# Altium footprint library MOLEX THD.PcbLib: 57 footprints (part 4 of 4) (continued)
## MOLEX_87831-1420_h [mm] "2.00mm (.079\") Pitch Milli-Grid™ Header, Vertical, Shrouded, Center Polarization Slot, Locking Window, 14 Circuits (Customized PCB Edge assembly)" (continued)
3D body "MOLEX_87831-1420_h.stp": height 2.35, standoff -3.95, extent -8.325,-2.5 8.325,6.4

## MOLEX_87833-1420 [mm] "2.00mm (.079\") Pitch Milli-Grid™ Header, Right Angle, Shrouded, Center Polarization Slot, Locking Window, 14 Circuits"
pads (14):
  round 1.6 hole 0.9: 1(-6,-1) 2(-6,1) 3(-4,-1) 4(-4,1) 5(-2,-1) 6(-2,1) 7(0,-1) 8(0,1) 9(2,-1) 10(2,1) 11(4,-1) 12(4,1) 13(6,-1) 14(6,1)
Top Overlay:
  lines w0.2: -7.5,2.7 -7.5,1 -7.1,1 ; -6.325,7.4 -5.825,6.534 -5.325,7.4 ; -5.5,2.7 -5.3,5.3 -4.95,5.3 -4.95,4.7 -3.05,4.7 -3.05,5.3 -2.7,5.3 -2.5,2.7 ; -1.8,7.4 cw(c-1.8,6.8) -1.2,6.8 -1.2,3.65 1.2,3.65 1.2,6.8 cw(c1.8,6.8) 1.8,7.4 ; -0.25,3.65 -0.25,6.65 ; 0.25,3.65 0.25,6.65 ; 2.5,2.7 2.7,5.3 3.05,5.3 3.05,4.7 4.95,4.7 4.95,5.3 5.3,5.3 5.5,2.7 ; 7.1,1 7.5,1 7.5,2.7 ; -0.25,6.65 0.25,6.65 ; -0.25,6.65 -0.1,7.25 0.1,7.25 0.25,6.65 ; -8.325,2.7 8.325,2.7 8.325,7.4 -8.325,7.4 -8.325,2.7
Mechanical 8:
  lines w0.1: -6.5,-1 -6,-1 ; -6.5,1 -6,1 ; -6,-0.5 -6,-1 ; -6,0.5 -6,1 ; -6,1.5 -6,1 ; -5.5,-1 -6,-1 ; -5.5,1 -6,1 ; -4.5,-1 -4,-1 ; -4.5,1 -4,1 ; -4,-0.5 -4,-1 ; -4,0.5 -4,1 ; -4,1.5 -4,1 ; -3.5,-1 -4,-1 ; -3.5,1 -4,1 ; -2.5,-1 -2,-1 ; -2.5,1 -2,1 ; -2,-0.5 -2,-1 ; -2,0.5 -2,1 ; -2,1.5 -2,1 ; -1.5,-1 -2,-1 ; -1.5,1 -2,1 ; -0.5,-1 0,-1 ; -0.5,1 0,1 ; 0,-0.5 0,-1 ; 0,0.5 0,1 ; 0,1.5 0,1 ; 0.5,-1 0,-1 ; 0.5,1 0,1 ; 1.5,-1 2,-1 ; 1.5,1 2,1 ; 2,-0.5 2,-1 ; 2,0.5 2,1 ; 2,1.5 2,1 ; 2.5,-1 2,-1 ; 2.5,1 2,1 ; 3.5,-1 4,-1 ; 3.5,1 4,1 ; 4,-0.5 4,-1 ; 4,0.5 4,1 ; 4,1.5 4,1 ; 4.5,-1 4,-1 ; 4.5,1 4,1 ; 5.5,-1 6,-1 ; 5.5,1 6,1 ; 6,-0.5 6,-1 ; 6,0.5 6,1 ; 6,1.5 6,1 ; 6.5,-1 6,-1 ; 6.5,1 6,1 ; -6,-1 -6,-1.5 -6,-1 ; -4,-1 -4,-1.5 -4,-1 ; -2,-1 -2,-1.5 -2,-1 ; 0,-1 0,-1.5 0,-1 ; 2,-1 2,-1.5 2,-1 ; 4,-1 4,-1.5 4,-1 ; 6,-1 6,-1.5 6,-1
Mechanical 14:
  lines w0.1: -7.5,2.7 -7.5,1 -6.65,1 -6.65,1.85 -5.35,1.85 -5.35,1 -4.65,1 -4.65,1.85 -3.35,1.85 -3.35,1 -2.65,1 -2.65,1.85 -1.35,1.85 -1.35,1 -0.65,1 -0.65,1.85 0.65,1.85 0.65,1 1.35,1 1.35,1.85 2.65,1.85 2.65,1 3.35,1 3.35,1.85 4.65,1.85 4.65,1 5.35,1 5.35,1.85 6.65,1.85 6.65,1 7.5,1 7.5,2.7 ; -6.65,1.35 -5.35,1.35 ; -6.325,7.4 -5.825,6.534 -5.325,7.4 ; -6.25,1.35 -6.25,-1.25 -5.75,-1.25 -5.75,1.35 ; -5.5,2.7 -5.3,5.3 -4.95,5.3 -4.95,4.7 -3.05,4.7 -3.05,5.3 -2.7,5.3 -2.5,2.7 ; -5.427,3.65 -3.4,3.65 -3.4,4.7 ; -4.65,1.35 -3.35,1.35 ; -4.4,3.65 -4.4,4.7 ; -4.25,1.35 -4.25,-1.25 -3.75,-1.25 -3.75,1.35 ; -4.25,3.65 -4.25,4.7 ; -3.75,3.65 -3.75,4.7 ; -3.6,3.65 -3.6,4.7 ; -2.65,1.35 -1.35,1.35 ; -2.25,1.35 -2.25,-1.25 -1.75,-1.25 -1.75,1.35 ; -1.8,7.4 cw(c-1.8,6.8) -1.2,6.8 -1.2,3.65 1.2,3.65 1.2,6.8 cw(c1.8,6.8) 1.8,7.4 ; -1.255,7.05 -0.4,7.05 -0.4,3.65 ; -0.4,6.8 -0.212,6.8 ; -0.25,1.35 -0.25,-1.25 0.25,-1.25 0.25,1.35 ; -0.25,3.65 -0.25,6.65 ; 0.212,6.8 0.4,6.8 ; 0.25,3.65 0.25,6.65 ; 0.4,3.65 0.4,7.05 1.255,7.05 ; 1.35,1.35 2.65,1.35 ; 1.75,1.35 1.75,-1.25 2.25,-1.25 2.25,1.35 ; 2.5,2.7 2.7,5.3 3.05,5.3 3.05,4.7 4.95,4.7 4.95,5.3 5.3,5.3 5.5,2.7 ; 3.35,1.35 4.65,1.35 ; 3.4,4.7 3.4,3.65 5.427,3.65 ; 3.6,3.65 3.6,4.7 ; 3.75,1.35 3.75,-1.25 4.25,-1.25 4.25,1.35 ; 3.75,3.65 3.75,4.7 ; 4.25,3.65 4.25,4.7 ; 4.4,3.65 4.4,4.7 ; 5.35,1.35 6.65,1.35 ; 5.75,1.35 5.75,-1.25 6.25,-1.25 6.25,1.35 ; -0.25,6.65 0.25,6.65 ; -0.25,6.65 -0.1,7.25 0.1,7.25 0.25,6.65 ; -8.325,2.7 8.325,2.7 8.325,7.4 -8.325,7.4 -8.325,2.7 ; -0.65,1.35 0.65,1.35 -0.65,1.35
3D body "MOLEX_87833-1420.stp": height 6.3, standoff -2.16, extent -8.325,-1.25 8.325,7.4

## MOLEX_90121-0772 [mm] "2.54mm (.100\") Pitch, 12 Circuits  Single Row  Right Angle C-Grid III Header"
height 3.6
pads (12):
  round 1.7 hole 1: 1(-13.97,0) 2(-11.43,0) 3(-8.89,0) 4(-6.35,0) 5(-3.81,0) 6(-1.27,0) 7(1.27,0) 8(3.81,0) 9(6.35,0) 10(8.89,0) 11(11.43,0) 12(13.97,0)
Top Overlay:
  circle w0.5: c-15.825,0.85 r0.25
  lines w0.2: -15.117,2.25 -15.117,1.75 ; -15.115,2.25 -15.117,1.75 ; -14.288,1.209 -14.288,2.25 ; -14.288,1.75 -15.117,1.75 ; -14.288,4.25 -14.288,11 -13.653,11 -13.653,4.25 ; -13.653,1.209 -13.653,2.25 ; -13.653,1.75 -12.823,1.75 -12.823,2.25 ; -12.577,2.25 -12.577,1.75 -11.748,1.75 ; -11.748,1.209 -11.748,2.25 ; -11.748,4.25 -11.748,11 -11.113,11 -11.113,4.25 ; -11.113,1.209 -11.113,2.25 ; -11.113,1.75 -10.283,1.75 -10.283,2.25 ; -10.037,2.25 -10.037,1.75 -9.208,1.75 ; -9.208,1.209 -9.208,2.25 ; -9.208,4.25 -9.208,11 -8.573,11 -8.573,4.25 ; -8.573,1.209 -8.573,2.25 ; -8.573,1.75 -7.743,1.75 -7.743,2.25 ; -7.497,2.25 -7.497,1.75 -6.668,1.75 ; -6.668,1.209 -6.668,2.25 ; -6.668,4.25 -6.668,11 -6.033,11 -6.033,4.25 ; -6.033,1.209 -6.033,2.25 ; -6.033,1.75 -5.203,1.75 -5.203,2.25 ; -4.957,2.25 -4.957,1.75 -4.128,1.75 ; -4.128,1.209 -4.128,2.25 ; -4.128,4.25 -4.128,11 -3.493,11 -3.493,4.25 ; -3.493,1.209 -3.493,2.25 ; -3.493,1.75 -2.663,1.75 -2.663,2.25 ; -2.417,2.25 -2.417,1.75 -1.587,1.75 ; -1.587,1.209 -1.587,2.25 ; -1.587,4.25 -1.587,11 -0.953,11 -0.953,4.25 ; -0.953,1.209 -0.953,2.25 ; -0.953,1.75 -0.123,1.75 -0.123,2.25 ; 0.123,2.25 0.123,1.75 0.953,1.75 ; 0.953,1.209 0.953,2.25 ; 0.953,4.25 0.953,11 1.587,11 1.587,4.25 ; 1.587,1.209 1.587,2.25 ; 1.587,1.75 2.417,1.75 2.417,2.25 ; 2.663,2.25 2.663,1.75 3.493,1.75 ; 3.493,1.209 3.493,2.25 ; 3.493,4.25 3.493,11 4.128,11 4.128,4.25 ; 4.128,1.209 4.128,2.25 ; 4.128,1.75 4.957,1.75 4.957,2.25 ; 5.203,2.25 5.203,1.75 6.033,1.75 ; 6.033,1.209 6.033,2.25 ; 6.033,4.25 6.033,11 6.668,11 6.668,4.25 ; 6.668,1.209 6.668,2.25 ; 6.668,1.75 7.497,1.75 7.497,2.25 ; 7.743,2.25 7.743,1.75 8.573,1.75 ; 8.573,1.209 8.573,2.25 ; 8.573,4.25 8.573,11 9.208,11 9.208,4.25 ; 9.208,1.209 9.208,2.25 ; 9.208,1.75 10.037,1.75 10.037,2.25 ; 10.283,2.25 10.283,1.75 11.113,1.75 ; 11.113,1.209 11.113,2.25 ; 11.113,4.25 11.113,11 11.748,11 11.748,4.25 ; 11.748,1.209 11.748,2.25 ; 11.748,1.75 12.577,1.75 12.577,2.25 ; 12.823,2.25 12.823,1.75 13.653,1.75 ; 13.653,1.209 13.653,2.25 ; 13.653,4.25 13.653,11 14.288,11 14.288,4.25 ; 14.288,1.209 14.288,2.25 ; 14.288,1.75 15.12,1.75 ; 15.117,1.75 15.117,2.25 ; -15.24,2.25 -15.24,4.25 15.24,4.25 15.24,2.25 -15.24,2.25
Mechanical 8:
  lines w0.1: -14.47,0 -13.97,0 ; -13.97,-0.5 -13.97,0 ; -13.97,0.5 -13.97,0 ; -13.47,0 -13.97,0 ; -11.93,0 -11.43,0 ; -11.43,-0.5 -11.43,0 ; -11.43,0.5 -11.43,0 ; -10.93,0 -11.43,0 ; -9.39,0 -8.89,0 ; -8.89,-0.5 -8.89,0 ; -8.89,0.5 -8.89,0 ; -8.39,0 -8.89,0 ; -6.85,0 -6.35,0 ; -6.35,-0.5 -6.35,0 ; -6.35,0.5 -6.35,0 ; -5.85,0 -6.35,0 ; -4.31,0 -3.81,0 ; -3.81,-0.5 -3.81,0 ; -3.81,0.5 -3.81,0 ; -3.31,0 -3.81,0 ; -1.77,0 -1.27,0 ; -1.27,-0.5 -1.27,0 ; -1.27,0.5 -1.27,0 ; -0.77,0 -1.27,0 ; -0.5,0 0,0 ; 0,-0.5 0,0 ; 0,0.5 0,0 ; 0.5,0 0,0 ; 0.77,0 1.27,0 ; 1.27,-0.5 1.27,0 ; 1.27,0.5 1.27,0 ; 1.77,0 1.27,0 ; 3.31,0 3.81,0 ; 3.81,-0.5 3.81,0 ; 3.81,0.5 3.81,0 ; 4.31,0 3.81,0 ; 5.85,0 6.35,0 ; 6.35,-0.5 6.35,0 ; 6.35,0.5 6.35,0 ; 6.85,0 6.35,0 ; 8.39,0 8.89,0 ; 8.89,-0.5 8.89,0 ; 8.89,0.5 8.89,0 ; 9.39,0 8.89,0 ; 10.93,0 11.43,0 ; 11.43,-0.5 11.43,0 ; 11.43,0.5 11.43,0 ; 11.93,0 11.43,0 ; 13.47,0 13.97,0 ; 13.97,-0.5 13.97,0 ; 13.97,0.5 13.97,0 ; 14.47,0 13.97,0
Mechanical 14:
  circle w0.5: c-15.825,0.85 r0.25
  lines w0.1: -15.117,2.25 -15.117,1.75 ; -15.115,2.25 -15.117,1.75 ; -14.288,1.75 -15.117,1.75 ; -14.288,2.25 -14.288,-0.318 -13.653,-0.318 -13.653,2.25 ; -14.288,4.25 -14.288,11 -13.653,11 -13.653,4.25 ; -13.653,1.75 -12.823,1.75 -12.823,2.25 ; -12.577,2.25 -12.577,1.75 -11.748,1.75 ; -11.748,2.25 -11.748,-0.318 -11.113,-0.318 -11.113,2.25 ; -11.748,4.25 -11.748,11 -11.113,11 -11.113,4.25 ; -11.113,1.75 -10.283,1.75 -10.283,2.25 ; -10.037,2.25 -10.037,1.75 -9.208,1.75 ; -9.208,2.25 -9.208,-0.318 -8.573,-0.318 -8.573,2.25 ; -9.208,4.25 -9.208,11 -8.573,11 -8.573,4.25 ; -8.573,1.75 -7.743,1.75 -7.743,2.25 ; -7.497,2.25 -7.497,1.75 -6.668,1.75 ; -6.668,2.25 -6.668,-0.318 -6.033,-0.318 -6.033,2.25 ; -6.668,4.25 -6.668,11 -6.033,11 -6.033,4.25 ; -6.033,1.75 -5.203,1.75 -5.203,2.25 ; -4.957,2.25 -4.957,1.75 -4.128,1.75 ; -4.128,2.25 -4.128,-0.318 -3.493,-0.318 -3.493,2.25 ; -4.128,4.25 -4.128,11 -3.493,11 -3.493,4.25 ; -3.493,1.75 -2.663,1.75 -2.663,2.25 ; -2.417,2.25 -2.417,1.75 -1.587,1.75 ; -1.587,2.25 -1.587,-0.318 -0.953,-0.318 -0.953,2.25 ; -1.587,4.25 -1.587,11 -0.953,11 -0.953,4.25 ; -0.953,1.75 -0.123,1.75 -0.123,2.25 ; 0.123,2.25 0.123,1.75 0.953,1.75 ; 0.953,2.25 0.953,-0.318 1.587,-0.318 1.587,2.25 ; 0.953,4.25 0.953,11 1.587,11 1.587,4.25 ; 1.587,1.75 2.417,1.75 2.417,2.25 ; 2.663,2.25 2.663,1.75 3.493,1.75 ; 3.493,2.25 3.493,-0.318 4.128,-0.318 4.128,2.25 ; 3.493,4.25 3.493,11 4.128,11 4.128,4.25 ; 4.128,1.75 4.957,1.75 4.957,2.25 ; 5.203,2.25 5.203,1.75 6.033,1.75 ; 6.033,2.25 6.033,-0.318 6.668,-0.318 6.668,2.25 ; 6.033,4.25 6.033,11 6.668,11 6.668,4.25 ; 6.668,1.75 7.497,1.75 7.497,2.25 ; 7.743,2.25 7.743,1.75 8.573,1.75 ; 8.573,2.25 8.573,-0.318 9.208,-0.318 9.208,2.25 ; 8.573,4.25 8.573,11 9.208,11 9.208,4.25 ; 9.208,1.75 10.037,1.75 10.037,2.25 ; 10.283,2.25 10.283,1.75 11.113,1.75 ; 11.113,2.25 11.113,-0.318 11.748,-0.318 11.748,2.25 ; 11.113,4.25 11.113,11 11.748,11 11.748,4.25 ; 11.748,1.75 12.577,1.75 12.577,2.25 ; 12.823,2.25 12.823,1.75 13.653,1.75 ; 13.653,2.25 13.653,-0.318 14.288,-0.318 14.288,2.25 ; 13.653,4.25 13.653,11 14.288,11 14.288,4.25 ; 14.288,1.75 15.12,1.75 ; 15.117,1.75 15.117,2.25 ; -15.24,2.25 -15.24,4.25 15.24,4.25 15.24,2.25 -15.24,2.25
3D body "MOLEX_90121-0772.stp": height 3.6, standoff -2.9, extent -15.24,-0.317 15.24,11

## MOLEX_90136-1206 [mm] "2.54mm (.100\") Pitch C-Grid III Header, Single Row, Vertical, Shrouded, 6 Circuits"
height 11.1
pads (6):
  round 1.7 hole 1: 1(-6.35,0) 2(-3.81,0) 3(-1.27,0) 4(1.27,0) 5(3.81,0) 6(6.35,0)
Top Overlay:
  lines w0.2: -6.667,-3.15 -6.35,-2.515 -6.032,-3.15 ; -9.295,-3.607 -9.295,3.124 -2.766,3.124 -2.591,3.607 2.591,3.607 2.766,3.124 9.295,3.124 9.295,-3.607 8.787,-3.607 8.786,-3.15 0.458,-3.148 0.457,-3.607 -0.457,-3.607 -0.457,-3.15 -8.787,-3.15 -8.787,-3.607 -9.295,-3.607 ; -8.344,-1.994 8.344,-1.994 8.344,1.968 2.23,1.968 1.984,3.365 -1.984,3.365 -2.23,1.968 -8.344,1.968 -8.344,-1.994
Mechanical 14:
  lines w0.1: -6.667,-3.15 -6.35,-2.515 -6.032,-3.15 ; -9.295,-3.607 -9.295,3.124 -2.766,3.124 -2.591,3.607 2.591,3.607 2.766,3.124 9.295,3.124 9.295,-3.607 8.787,-3.607 8.786,-3.15 0.458,-3.148 0.457,-3.607 -0.457,-3.607 -0.457,-3.15 -8.787,-3.15 -8.787,-3.607 -9.295,-3.607 ; -8.344,-1.994 8.344,-1.994 8.344,1.968 2.23,1.968 1.984,3.365 -1.984,3.365 -2.23,1.968 -8.344,1.968 -8.344,-1.994
3D body "MOLEX_901361206.stp": height 10.9, standoff -2.9, extent -9.485,-3.605 9.485,3.605

## MOLEX_90136-1212 [mm] "2.54mm (.100\") Pitch C-Grid III Header, Single Row, Vertical, Shrouded, 12 Circuits"
height 11.1
pads (12):
  round 1.7 hole 1: 1(-13.97,0) 2(-11.43,0) 3(-8.89,0) 4(-6.35,0) 5(-3.81,0) 6(-1.27,0) 7(1.27,0) 8(3.81,0) 9(6.35,0) 10(8.89,0) 11(11.43,0) 12(13.97,0)
Top Overlay:
  lines w0.2: -16,-1.5 16,-1.5 ; -16,1.5 16,1.5 ; -14.21,-2.825 -13.892,-2.19 -13.575,-2.825 ; -2.023,1.915 -1.908,3.235 1.908,3.235 2.023,1.915 ; -2.005,2.115 -16.2,2.115 ; -1.925,3.035 1.925,3.035 ; 2.005,2.115 16.2,2.115 ; -16.2,-2.115 -16,-1.915 ; -16.2,-2.115 -16.2,2.115 ; -16.2,-2.115 16.2,-2.115 ; -16.2,2.115 -16,1.915 ; -16,-1.915 -16,1.915 ; -16,-1.915 16,-1.915 ; -16,1.915 16,1.915 ; 16,-1.915 16.2,-2.115 ; 16,-1.915 16,1.915 ; 16,1.915 16.2,2.115 ; 16.2,-2.115 16.2,2.115 ; -16.915,-3.605 -16.915,2.825 -2.869,2.825 -2.585,3.605 2.585,3.605 2.869,2.825 16.915,2.825 16.915,-3.605 16.015,-3.605 16.015,-2.975 ccw(c15.865,-2.975) 15.865,-2.825 1.05,-2.825 ccw(c1.05,-2.975) 0.9,-2.975 0.9,-3.605 -0.9,-3.605 -0.9,-2.975 ccw(c-1.05,-2.975) -1.05,-2.825 -15.865,-2.825 ccw(c-15.865,-2.975) -16.015,-2.975 -16.015,-3.605 -16.915,-3.605
Mechanical 8:
  lines w0.1: -14.47,0 -13.97,0 ; -13.97,-0.5 -13.97,0 ; -13.97,0.5 -13.97,0 ; -13.47,0 -13.97,0 ; -11.93,0 -11.43,0 ; -11.43,-0.5 -11.43,0 ; -11.43,0.5 -11.43,0 ; -10.93,0 -11.43,0 ; -9.39,0 -8.89,0 ; -8.89,-0.5 -8.89,0 ; -8.89,0.5 -8.89,0 ; -8.39,0 -8.89,0 ; -6.85,0 -6.35,0 ; -6.35,-0.5 -6.35,0 ; -6.35,0.5 -6.35,0 ; -5.85,0 -6.35,0 ; -4.31,0 -3.81,0 ; -3.81,-0.5 -3.81,0 ; -3.81,0.5 -3.81,0 ; -3.31,0 -3.81,0 ; -1.77,0 -1.27,0 ; -1.27,-0.5 -1.27,0 ; -1.27,0.5 -1.27,0 ; -0.77,0 -1.27,0 ; -0.5,0 0,0 ; 0,-0.5 0,0 ; 0,0.5 0,0 ; 0.5,0 0,0 ; 0.77,0 1.27,0 ; 1.27,-0.5 1.27,0 ; 1.27,0.5 1.27,0 ; 1.77,0 1.27,0 ; 3.31,0 3.81,0 ; 3.81,-0.5 3.81,0 ; 3.81,0.5 3.81,0 ; 4.31,0 3.81,0 ; 5.85,0 6.35,0 ; 6.35,-0.5 6.35,0 ; 6.35,0.5 6.35,0 ; 6.85,0 6.35,0 ; 8.39,0 8.89,0 ; 8.89,-0.5 8.89,0 ; 8.89,0.5 8.89,0 ; 9.39,0 8.89,0 ; 10.93,0 11.43,0 ; 11.43,-0.5 11.43,0 ; 11.43,0.5 11.43,0 ; 11.93,0 11.43,0 ; 13.47,0 13.97,0 ; 13.97,-0.5 13.97,0 ; 13.97,0.5 13.97,0 ; 14.47,0 13.97,0
Mechanical 14:
  lines w0.1: -16,-1.5 16,-1.5 ; -16,1.5 16,1.5 ; -14.21,-2.825 -13.892,-2.19 -13.575,-2.825 ; -2.023,1.915 -1.908,3.235 1.908,3.235 2.023,1.915 ; -2.005,2.115 -16.2,2.115 ; -1.925,3.035 1.925,3.035 ; 2.005,2.115 16.2,2.115 ; -16.2,-2.115 -16,-1.915 ; -16.2,-2.115 -16.2,2.115 ; -16.2,-2.115 16.2,-2.115 ; -16.2,2.115 -16,1.915 ; -16,-1.915 -16,1.915 ; -16,-1.915 16,-1.915 ; -16,1.915 16,1.915 ; 16,-1.915 16.2,-2.115 ; 16,-1.915 16,1.915 ; 16,1.915 16.2,2.115 ; 16.2,-2.115 16.2,2.115 ; -16.915,-3.605 -16.915,2.825 -2.869,2.825 -2.585,3.605 2.585,3.605 2.869,2.825 16.915,2.825 16.915,-3.605 16.015,-3.605 16.015,-2.975 ccw(c15.865,-2.975) 15.865,-2.825 1.05,-2.825 ccw(c1.05,-2.975) 0.9,-2.975 0.9,-3.605 -0.9,-3.605 -0.9,-2.975 ccw(c-1.05,-2.975) -1.05,-2.825 -15.865,-2.825 ccw(c-15.865,-2.975) -16.015,-2.975 -16.015,-3.605 -16.915,-3.605
3D body "MOLEX_90136-1212.stp": height 10.9, standoff -2.9, extent -16.915,-3.605 16.915,3.605

## MOLEX_500075-1517 [mm] "Straight, USB Serie Mini-B Type 2 Through Hole Receptacle"
height 7.7
pads (7):
  round 1.25 hole 0.7: 1(1.6,1.3) 2(0.8,-1.3) 3(0,1.3) 4(-0.8,-1.3) 5(-1.6,1.3)
  oval 1.4x3.9 hole 0.7 slot 2.4 at 90 deg: 6(-3.65,0) 6(3.65,0)
Top Overlay:
  lines w0.2: -3.322,2.3 3.322,2.3 ; -2.9,-2.055 -2.9,-2.4 -2.25,-2.4 -2.25,-1.9 ; -2.763,-1.9 -1.6,-1.9 ; -2.189,0.492 -2.3,0.3 -2.3,-0.3 -2.2,-0.4 -1.236,-0.4 ; -1.825,0.35 -1.825,-0.1 -1.425,-0.1 -1.425,0.35 ; -0.364,-0.4 0.364,-0.4 ; -0.225,0.35 -0.225,-0.1 0.175,-0.1 0.175,0.35 ; 1.236,-0.4 2.2,-0.4 ; 1.4,0.35 1.4,-0.1 1.8,-0.1 1.8,0.35 ; 1.6,-1.9 2.763,-1.9 ; 2.189,0.492 2.3,0.3 2.3,-0.3 ; 2.25,-1.9 2.25,-2.4 2.9,-2.4 2.9,-2.055 ; 2.2,-0.4 2.3,-0.3 ; 2.2,-0.4 2.3,-0.3 ; -1,-0.1 -1,0.5 -0.6,0.5 -0.6,-0.1 -1,-0.1 ; 0.6,-0.1 0.6,0.5 1,0.5 1,-0.1 0.6,-0.1
Mechanical 8:
  lines w0.1: -4.15,0 -3.65,0 ; -3.65,-0.5 -3.65,0 ; -3.65,0.5 -3.65,0 ; -3.15,0 -3.65,0 ; -2.1,1.3 -1.6,1.3 ; -1.6,0.8 -1.6,1.3 ; -1.6,1.8 -1.6,1.3 ; -1.3,-1.3 -0.8,-1.3 ; -1.1,1.3 -1.6,1.3 ; -0.8,-1.8 -0.8,-1.3 ; -0.8,-0.8 -0.8,-1.3 ; -0.5,0 0,0 ; -0.5,1.3 0,1.3 ; -0.3,-1.3 -0.8,-1.3 ; 0,-0.5 0,0 ; 0,0.5 0,0 ; 0,0.8 0,1.3 ; 0,1.8 0,1.3 ; 0.3,-1.3 0.8,-1.3 ; 0.5,0 0,0 ; 0.5,1.3 0,1.3 ; 0.8,-1.8 0.8,-1.3 ; 0.8,-0.8 0.8,-1.3 ; 1.1,1.3 1.6,1.3 ; 1.3,-1.3 0.8,-1.3 ; 1.6,0.8 1.6,1.3 ; 1.6,1.8 1.6,1.3 ; 2.1,1.3 1.6,1.3 ; 3.15,0 3.65,0 ; 3.65,-0.5 3.65,0 ; 3.65,0.5 3.65,0 ; 4.15,0 3.65,0 ; -4.35,-1.25 ccw(c-3.65,-1.25) -2.95,-1.25 -2.95,1.25 ccw(c-3.65,1.25) -4.35,1.25 -4.35,-1.25 ; -3.975,-0.875 ccw(c-3.65,-0.875) -3.325,-0.875 -3.325,0.875 ccw(c-3.65,0.875) -3.975,0.875 -3.975,-0.875 ; 2.95,-1.25 ccw(c3.65,-1.25) 4.35,-1.25 4.35,1.25 ccw(c3.65,1.25) 2.95,1.25 2.95,-1.25 ; 3.325,-0.875 ccw(c3.65,-0.875) 3.975,-0.875 3.975,0.875 ccw(c3.65,0.875) 3.325,0.875 3.325,-0.875
Mechanical 14:
  lines w0.1: -3.45,0.288 -3.45,2.3 3.45,2.3 3.45,0.288 ; -3.45,2.05 -3.55,2.05 ccw(c-3.55,1.75) -3.85,1.75 -3.85,-0.403 ; -2.9,-1.9 -2.9,-2.4 -2.25,-2.4 -2.25,-1.9 ; 2.25,-1.9 2.25,-2.4 2.9,-2.4 2.9,-1.9 ; 3.45,2.05 3.55,2.05 cw(c3.55,1.75) 3.85,1.75 3.85,-0.403 ; -3.85,-0.403 cw(c-3.15,-0.403) -3.647,0.089 -3.422,0.317 ccw(c-3.635,0.528) -3.335,0.528 -3.335,1.3 cw(c-2.635,1.3) -2.635,2 2.635,2 cw(c2.635,1.3) 3.335,1.3 3.335,0.528 ccw(c3.635,0.528) 3.422,0.317 3.647,0.089 cw(c3.15,-0.403) 3.85,-0.403 ; -3.85,-0.403 -3.85,-1.2 ccw(c-3.15,-1.2) -3.15,-1.9 3.15,-1.9 ccw(c3.15,-1.2) 3.85,-1.2 3.85,-0.403 ; 2.2,-0.4 2.3,-0.3 ; 2.2,-0.4 -2.2,-0.4 -2.3,-0.3 -2.3,0.3 -1.838,1.1 -1.318,1.1 -1.118,0.9 1.118,0.9 1.318,1.1 1.838,1.1 2.3,0.3 2.3,-0.3 ; 2.2,-0.4 2.3,-0.3 ; -3.45,-1.2 ccw(c-3.15,-1.2) -3.15,-1.5 3.15,-1.5 ccw(c3.15,-1.2) 3.45,-1.2 3.45,-0.403 ccw(c3.15,-0.403) 3.363,-0.192 3.138,0.035 cw(c3.635,0.528) 2.935,0.528 2.935,1.3 ccw(c2.635,1.3) 2.635,1.6 -2.635,1.6 ccw(c-2.635,1.3) -2.935,1.3 -2.935,0.528 cw(c-3.635,0.528) -3.138,0.035 -3.363,-0.192 ccw(c-3.15,-0.403) -3.45,-0.403 -3.45,-1.2 ; -1.825,-0.1 -1.825,0.5 -1.425,0.5 -1.425,-0.1 -1.825,-0.1 ; -1,-0.1 -1,0.5 -0.6,0.5 -0.6,-0.1 -1,-0.1 ; -0.225,-0.1 -0.225,0.5 0.175,0.5 0.175,-0.1 -0.225,-0.1 ; 0.6,-0.1 0.6,0.5 1,0.5 1,-0.1 0.6,-0.1 ; 1.4,-0.1 1.4,0.5 1.8,0.5 1.8,-0.1 1.4,-0.1
3D body "MOLEX_500075-1517.stp": height 7.7, standoff -2.1, extent -3.85,-2.4 3.85,2.3

## MOLEX_758000001 [mm] "0.75mm (.030\") Pitch Advanced Mezzanine Card Connector, B+ Style, Right Angle, 170 Circuit, 0.76µm (30µ\") Gold (Au), Standard Height, with PCB Locator, Tin (Sn) Tail Plating"
height 21.85
pads (204):
  round 1 hole 2.9 unplated mask+1.1: 171(-34.77,-1.6) 172(34.77,-1.6)
  round 1 hole 7 unplated mask+3.2: 173(-37.5,4.4) 174(37.5,4.4)
  round 1 hole 0.5: B1(31.5,-3.8) B2(30.375,-2.7) B3(30.375,-1.1) B4(29.25,-3.8) B5(28.125,-2.7) B6(28.125,-1.1) B7(27,-3.8) B8(25.875,-2.7) B9(25.875,-1.1) B10(24.75,-3.8) B10(24.75,-3.8) B11(23.625,-2.7) B12(23.625,-1.1) B13(22.5,-3.8) B14(21.375,-2.7) B15(21.375,-1.1) B16(20.25,-3.8) B17(19.125,-2.7) B18(19.125,-1.1) B19(18,-3.8) B20(16.875,-2.7) B21(16.875,-1.1) B22(15.75,-3.8) B23(14.625,-2.7) B24(14.625,-1.1) B25(13.5,-3.8) B26(12.375,-2.7) B27(12.375,-1.1) B28(11.25,-3.8) B29(10.125,-2.7) B30(10.125,-1.1) B31(9,-3.8) B32(7.875,-2.7) B33(7.875,-1.1) B34(6.75,-3.8) B35(5.625,-2.7) B36(5.625,-1.1) B37(4.5,-3.8) B38(3.375,-2.7) B39(3.375,-1.1) B40(2.25,-3.8) B41(1.125,-2.7) B42(1.125,-1.1) B43(0,-3.8) B44(-1.125,-2.7) B45(-1.125,-1.1) B46(-2.25,-3.8) B47(-3.375,-2.7) B48(-3.375,-1.1) B49(-4.5,-3.8) B50(-5.625,-2.7) B51(-5.625,-1.1) B52(-6.75,-3.8) B53(-7.875,-2.7) B54(-7.875,-1.1) B55(-9,-3.8) B56(-10.125,-2.7) B57(-10.125,-1.1) B58(-11.25,-3.8) B59(-12.375,-2.7) B60(-12.375,-1.1) B61(-13.5,-3.8) B62(-14.625,-2.7) B63(-14.625,-1.1) B64(-15.75,-3.8) B65(-16.875,-2.7) B66(-16.875,-1.1) B67(-18,-3.8) B68(-19.125,-2.7) B69(-19.125,-1.1) B70(-20.25,-3.8) B71(-21.375,-2.7) B72(-21.375,-1.1) B73(-22.5,-3.8) B74(-23.625,-2.7) B75(-23.625,-1.1) B76(-24.75,-3.8) B77(-25.875,-2.7) B78(-25.875,-1.1) B79(-27,-3.8) B80(-28.125,-2.7) B81(-28.125,-1.1) B82(-29.25,-3.8) B83(-30.375,-2.7) B84(-30.375,-1.1) B85(-31.5,-3.8) B86(-31.5,0) B87(-30.375,2.7) B88(-30.375,1.1) B89(-29.25,0) B90(-28.125,2.7) B91(-28.125,1.1) B92(-27,0) B93(-25.875,2.7) B94(-25.875,1.1) B95(-24.75,0) B96(-23.625,2.7) B97(-23.625,1.1) B98(-22.5,0) B99(-21.375,2.7) B100(-21.375,1.1) B101(-20.25,0) B102(-19.125,2.7) B103(-19.125,1.1) B104(-18,0) B105(-16.875,2.7) B106(-16.875,1.1) B107(-15.75,0) B108(-14.625,2.7) B109(-14.625,1.1) B110(-13.5,0) B111(-12.375,2.7) B112(-12.375,1.1) B113(-11.25,0) B114(-10.125,2.7) B115(-10.125,1.1) B116(-9,0) B117(-7.875,2.7) B118(-7.875,1.1) B119(-6.75,0) B120(-5.625,2.7) B121(-5.625,1.1) B122(-4.5,0) B123(-3.375,2.7) B124(-3.375,1.1) B125(-2.25,0) B126(-1.125,2.7) B127(-1.125,1.1) B128(0,0) B129(1.125,2.7) B130(1.125,1.1) B131(2.25,0) B132(3.375,2.7) B133(3.375,1.1) B134(4.5,0) B135(5.625,2.7) B136(5.625,1.1) B137(6.75,0) B138(7.875,2.7) B139(7.875,1.1) B140(9,0) B141(10.125,2.7) B142(10.125,1.1) B143(11.25,0) B144(12.375,2.7) B145(12.375,1.1) B146(13.5,0) B147(14.625,2.7) B148(14.625,1.1) B149(15.75,0) B150(16.875,2.7) B151(16.875,1.1) B152(18,0) B153(19.125,2.7) B154(19.125,1.1) B155(20.25,0) B156(21.375,2.7) B157(21.375,1.1) B158(22.5,0) B159(23.625,2.7) B160(23.625,1.1) B161(24.75,0) B162(25.875,2.7) B163(25.875,1.1) B164(27,0) B165(28.125,2.7) B166(28.125,1.1) B167(29.25,0) B168(30.375,2.7) B169(30.375,1.1) B170(31.5,0) Shie(-27,3.8) Shie(-24.75,3.8) Shie(-22.5,3.8) Shie(-20.25,3.8) Shie(-18,3.8) Shie(-15.75,3.8) Shie(-13.5,3.8) Shie(-11.25,3.8) Shie(-9,3.8) Shie(-6.75,3.8) Shie(-4.5,3.8) Shie(-2.25,3.8) Shie(0,3.8) Shie(2.25,3.8) Shie(4.5,3.8) Shie(6.75,3.8) Shie(9,3.8) Shie(11.25,3.8) Shie(13.5,3.8) Shie(15.75,3.8) Shie(18,3.8) Shie(20.25,3.8) Shie(22.5,3.8) Shie(24.75,3.8) Shie(27,3.8) Shie(29.25,3.8) Shie(31.5,3.8) Shield(-31.5,3.8) Shield(-29.25,3.8)
Top Overlay:
  circle w0.2: c35.75,-5.52 r1.2
  circle w0.2: c-35.75,-5.52 r1.2
  lines w0.2: -37.4,0.501 -37.4,-9.02 37.4,-9.02 37.4,0.501 ; -33.61,4.12 -32.341,4.12 ; 32.341,4.12 33.61,4.12
Mechanical 8:
  drawing of 820 lines, arcs and shapes, not listed
Mechanical 14:
  circle w0.1: c35.75,-5.52 r1.2
  circle w0.1: c-35.75,-5.52 r1.2
  lines w0.1: -37.4,0.901 ccw(c-37.5,4.4) -34.011,4.12 ; 34.011,4.12 ccw(c37.5,4.4) 37.4,0.901 ; -37.4,1.957 ccw(c-37.5,4.38) -35.089,4.12 ; -37.4,1.957 -37.4,3.184 ccw(c-37.5,4.38) -37.4,5.576 -37.4,7.605 cw(c-37.5,4.38) -34.284,4.12 -35.089,4.12 ; -37.4,1.957 -37.4,-9.02 37.4,-9.02 37.4,1.957 ; -35.089,4.12 35.089,4.12 ; 35.089,4.12 ccw(c37.5,4.38) 37.4,1.957 ; 35.089,4.12 34.284,4.12 cw(c37.5,4.38) 37.4,7.605 37.4,5.576 ccw(c37.5,4.38) 37.4,3.184 37.4,1.957
Drill Drawing:
  lines w0.2: -32.625,-5.062 32.625,-5.062 32.625,5.062 -32.625,5.062 -32.625,-5.062
  text "PRESS-FIT TECHNOLOGY diam. 0.45mm +0.06/-0.04" at -18,-6.75 h1
3D body "MOLEX_758000-001.stp": height 22.35, standoff -5.8, extent -37.4,-9.02 37.4,7.605